# Altium footprint library GetRekftified.PcbLib: 15 footprints
Each footprint in its own frame and in the unit in brackets; x right, y up, seen from the top. Pads: shape width x height; smd on the part's side, far side on the other; paste and mask are expansions set on the pad; w line width, h text height; cw(c..) or ccw(c..) is an arc to the next point about the centre after c.
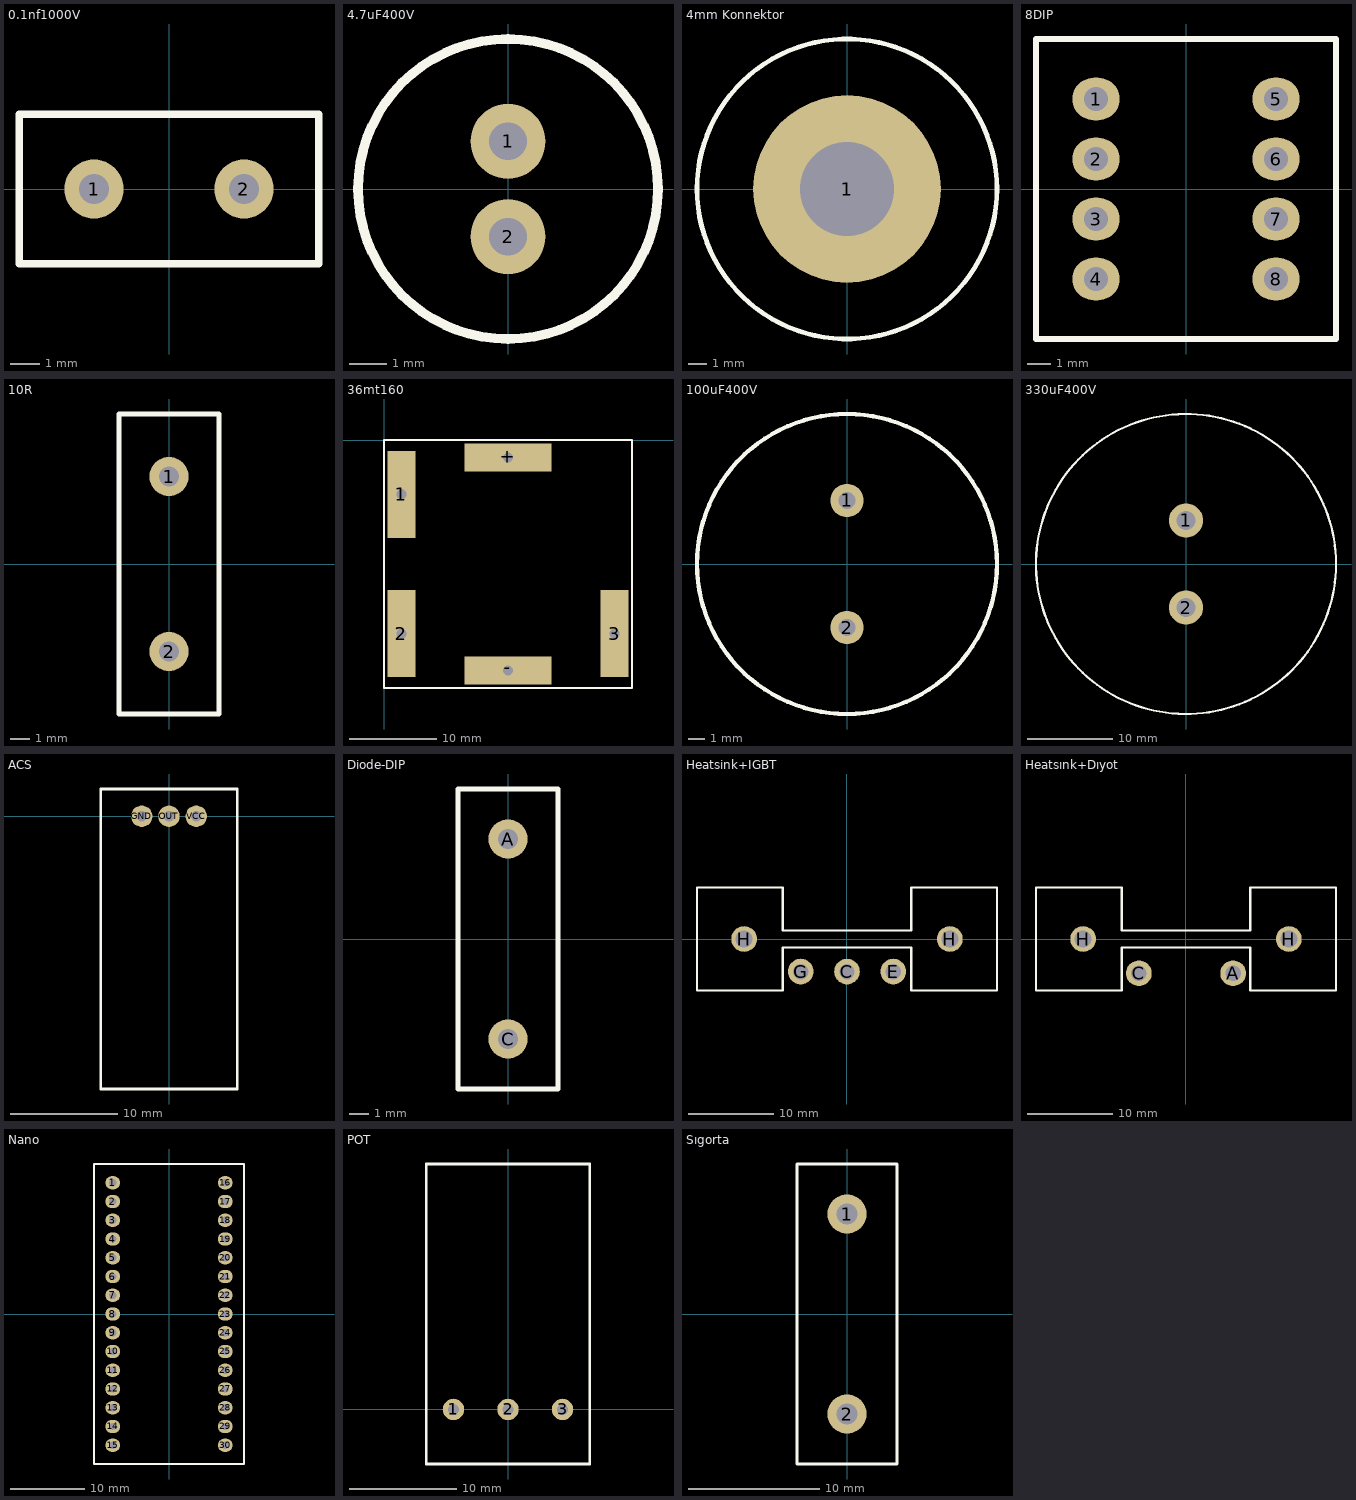
[diagram p0: the footprints below, top view; thin cyan lines are the x and y axes]

## 0.1nf1000V [mm] "C?"
pads (2):
  round 2 hole 1: 1(-2.54,0) 2(2.54,0)
Top Overlay:
  lines w0.254: -5.08,-2.54 -5.08,2.54 5.08,2.54 5.08,-2.54 -5.08,-2.54
3D body "0.1nF.stp": height 5.11, standoff -6.97, extent -2.795,-1.275 2.795,1.27

## 4.7uF400V [mm] "C?"
pads (2):
  round 2 hole 1: 1(0,1.27) 2(0,-1.27)
Top Overlay:
  circle w0.254: c0,0 r4
3D body "4.7uF.stp": height 17.3, standoff -19.7, extent -5.25,-5.25 5.25,5.25

## 4mm Konnektor [mm] "K?"
pads (1):
  round 10 hole 5: 1(0,0)
Top Overlay:
  circle w0.254: c0,0 r8
3D body: height 10, standoff 0, extent -8,-8 8,8

## 8DIP [mm] "K?"
pads (8):
  oval 2x1.8 hole 1: 1(-3.81,3.81) 2(-3.81,1.27) 3(-3.81,-1.27) 4(-3.81,-3.81) 5(3.81,3.81) 6(3.81,1.27) 7(3.81,-1.27) 8(3.81,-3.81)
Top Overlay:
  lines w0.254: -6.35,-6.35 -6.35,6.35 6.35,6.35 6.35,-6.35 -6.35,-6.35
3D body "TLP250HF(F).STEP": height 4.85, standoff -2.5, extent -4.287,-4.83 4.287,4.83

## 10R [mm] "R?"
pads (2):
  round 2 hole 1: 1(0,4.445) 2(0,-4.445)
Top Overlay:
  lines w0.254: -2.54,-7.62 -2.54,7.62 2.54,7.62 2.54,-7.62 -2.54,-7.62
3D body "User Library-Resistor_PTH_CFR-25_Yageo_250mW.step": height 2.4, standoff -2.6, extent -1.2,-4.72 1.2,4.72

## 36mt160 [mm] "36mt160"
pads (5):
  rect 3.2x10 hole 1.2 square: 1(2,-6.25) 2(2,-22.25) 3(26.5,-22.25)
  rect 10x3.2 hole 1.2 square: +(14.25,-2) -(14.25,-26.5)
Top Overlay:
  lines w0.254: 0,-28.5 0,0 28.5,0 28.5,-28.5 0,-28.5
3D body "User Library-36MT160.step": height 13, standoff -8, extent 0,-28.5 28.5,0

## 100uF400V [mm] "C?"
pads (2):
  round 2 hole 1: 1(0,3.81) 2(0,-3.81)
Top Overlay:
  circle w0.254: c0,0 r9
3D body "100uF.stp": height 37.5, standoff -6.29, extent -16.263,-16.263 16.263,16.263

## 330uF400V [mm] "C?"
pads (2):
  round 4 hole 2.2: 1(0,5.08) 2(0,-5.08)
Top Overlay:
  circle w0.254: c0,0 r17.5
3D body "alc40a331dd400.stp": height 42, standoff -7.29, extent -25.456,-25.456 25.456,25.456

## ACS [mm] "K?"
pads (3):
  round 2 hole 1: GND(-2.54,0) OUT(0,0) VCC(2.54,0)
Top Overlay:
  lines w0.254: -6.35,-25.4 -6.35,2.54 6.35,2.54 6.35,-25.4 -6.35,-25.4
3D body "acs712.STEP": height 13.51, standoff -1.4, extent -6.65,-27.03 6.65,4.17

## Diode-DIP [mm] "D?"
pads (2):
  round 2 hole 1: A(0,5.08) C(0,-5.08)
Top Overlay:
  lines w0.254: -2.54,-7.62 -2.54,7.62 2.54,7.62 2.54,-7.62 -2.54,-7.62
3D body "User Library-1N4004.step": height 2.85, standoff -2.5, extent -1.303,-6.525 1.397,6.525

## Heatsink+IGBT [mm] "M?"
pads (5):
  round 3 hole 1.8: C(0,-3.8) E(5.4,-3.8) G(-5.4,-3.8)
  round 3 hole 2: H(-12,0) H(12,0)
Top Overlay:
  lines w0.254: -17.5,-6 -17.5,6 -7.5,6 -7.5,1 7.5,1 7.5,6 17.5,6 17.5,-6 7.5,-6 7.5,-1 -7.5,-1 -7.5,-6 -17.5,-6
3D body "AAVID-SW25.step": height 26, standoff -3, extent -17.25,-6.15 17.25,6.35
3D body "IGBT_CW-TO-247.step": height 25.15, standoff -14.1, extent -7.875,-6.35 7.875,-1.2

## Heatsınk+Dıyot [mm] "D?"
pads (4):
  round 3 hole 1.8: A(5.5,-4) C(-5.5,-4)
  round 3 hole 2: H(-12,0) H(12,0)
Top Overlay:
  lines w0.254: -17.5,-6 -17.5,6 -7.5,6 -7.5,1 7.5,1 7.5,6 17.5,6 17.5,-6 7.5,-6 7.5,-1 -7.5,-1 -7.5,-6 -17.5,-6
3D body "IGBT_CW-TO-247.step": height 25.15, standoff -14.1, extent -7.875,-6.35 7.875,-1.2
3D body "AAVID-SW25.step": height 26, standoff -3, extent -17.25,-6.25 17.25,6.25

## Nano [mm] "K?"
pads (30):
  oval 2x1.8 hole 1: 1(-7.62,17.78) 2(-7.62,15.24) 3(-7.62,12.7) 4(-7.62,10.16) 5(-7.62,7.62) 6(-7.62,5.08) 7(-7.62,2.54) 8(-7.62,0) 9(-7.62,-2.54) 10(-7.62,-5.08) 11(-7.62,-7.62) 12(-7.62,-10.16) 13(-7.62,-12.7) 14(-7.62,-15.24) 15(-7.62,-17.78) 16(7.62,17.78) 17(7.62,15.24) 18(7.62,12.7) 19(7.62,10.16) 20(7.62,7.62) 21(7.62,5.08) 22(7.62,2.54) 23(7.62,0) 24(7.62,-2.54) 25(7.62,-5.08) 26(7.62,-7.62) 27(7.62,-10.16) 28(7.62,-12.7) 29(7.62,-15.24) 30(7.62,-17.78)
Top Overlay:
  lines w0.254: -10.16,-20.32 10.16,-20.32 10.16,20.32 -10.16,20.32 -10.16,-20.32
3D body "User Library-arduino_nano.STEP": height 14.1, standoff -4.5, extent -9.017,-21.738 8.983,23.262

## POT [mm] "R?"
pads (3):
  round 2 hole 1: 1(-5.08,0) 2(0,0) 3(5.08,0)
Top Overlay:
  lines w0.254: -7.62,-5.08 -7.62,22.86 7.62,22.86 7.62,-5.08 -7.62,-5.08
3D body "User Library-Potentiometer.step": height 21.38, standoff -3.56, extent -8.382,-5.08 8.382,19.05

## Sıgorta [mm] "F?"
pads (2):
  round 3 hole 1.6: 1(0,7.62) 2(0,-7.62)
Top Overlay:
  lines w0.254: -3.81,-11.43 3.81,-11.43 3.81,11.43 -3.81,11.43 -3.81,-11.43
3D body "CircuitWorks-FUSE.step": height 8.84, standoff -4.01, extent -2.952,-15.44 2.952,15.44